# Altium footprint library 电阻封装库.PcbLib: 54 footprints (part 1 of 4)
Each footprint in its own frame and in the unit in brackets; x right, y up, seen from the top. Pads: shape width x height; smd on the part's side, far side on the other; paste and mask are expansions set on the pad; w line width, h text height; cw(c..) or ccw(c..) is an arc to the next point about the centre after c.
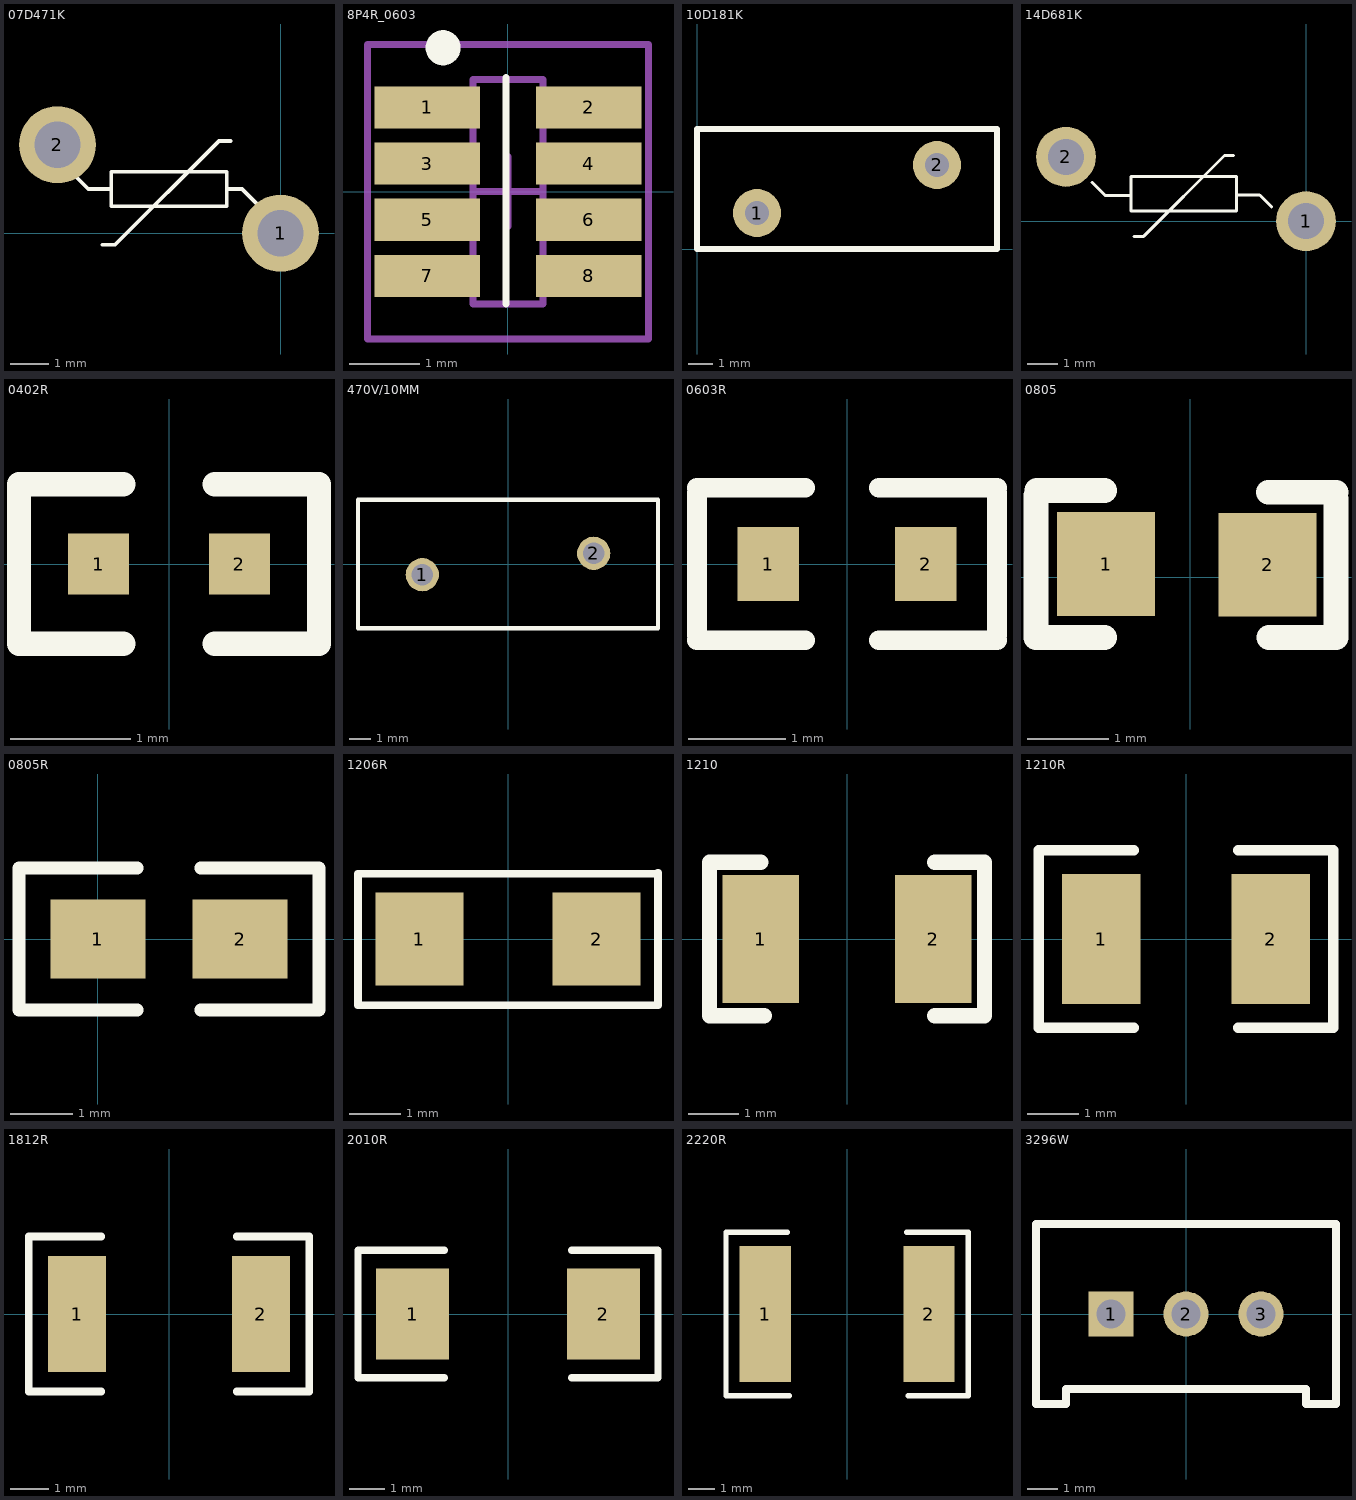
[diagram p0: the footprints below, top view; thin cyan lines are the x and y axes]

## 07D471K [mm]
pads (2):
  round 2 hole 1.2: 1(0,0) 2(-5.8,2.3)
Top Overlay:
  lines w0.1: -5.45,1.6 -5,1.15 -4.4,1.15 ; -4.625,-0.3 -4.3,-0.3 -1.6,2.4 -1.3,2.4 ; -1.4,1.15 -1,1.15 -0.6,0.75 ; -4.4,0.7 -4.4,1.6 -1.4,1.6 -1.4,0.7 -4.4,0.7

## 8P4R_0603 [mm]
pads (8):
  rect 1.5x0.6 smd: 1(-1.15,1.2) 2(1.15,1.2) 3(-1.15,0.4) 4(1.15,0.4) 5(-1.15,-0.4) 6(1.15,-0.4) 7(-1.15,-1.2) 8(1.15,-1.2)
Top Overlay:
  circle w0.25: c-0.925,2.05 r0.125
  lines w0.1: -0.025,-1.6 -0.025,1.626
Mechanical 13:
  lines w0.1: -0.5,-1.6 -0.5,1.6 0.5,1.6 0.5,-1.6 -0.5,-1.6
Mechanical 15:
  lines w0.1: -0.5,0 0.5,0 ; 0,-0.5 0,0.5 ; -2,-2.1 -2,2.1 2,2.1 2,-2.1 -2,-2.1
3D body: height 0.6, standoff 0.1, extent -0.5,-1.6 0.5,1.6
3D body: height 0.6, standoff 0.5, extent -0.838,0.914 -0.483,1.473
3D body: height 0.15, standoff 0, extent -1.219,0.914 -0.838,1.473
3D body: height 0.6, standoff 0, extent -0.864,0.914 -0.813,1.473
3D body: height 0.6, standoff 0.5, extent -0.838,0.127 -0.483,0.686
3D body: height 0.15, standoff 0, extent -1.219,0.127 -0.838,0.686
3D body: height 0.6, standoff 0, extent -0.864,0.127 -0.813,0.686
3D body: height 0.6, standoff 0.5, extent -0.838,-0.686 -0.483,-0.127
3D body: height 0.15, standoff 0, extent -1.219,-0.686 -0.838,-0.127
3D body: height 0.6, standoff 0, extent -0.864,-0.686 -0.813,-0.127
3D body: height 0.6, standoff 0.5, extent -0.838,-1.473 -0.483,-0.914
3D body: height 0.15, standoff 0, extent -1.219,-1.473 -0.838,-0.914
3D body: height 0.6, standoff 0, extent -0.864,-1.473 -0.813,-0.914
3D body: height 0.6, standoff 0, extent 0.813,0.914 0.864,1.473
3D body: height 0.15, standoff 0, extent 0.838,0.914 1.219,1.473
3D body: height 0.6, standoff 0.5, extent 0.483,0.914 0.838,1.473
3D body: height 0.6, standoff 0, extent 0.813,0.127 0.864,0.686
3D body: height 0.15, standoff 0, extent 0.838,0.127 1.219,0.686
3D body: height 0.6, standoff 0.5, extent 0.483,0.127 0.838,0.686
3D body: height 0.6, standoff 0, extent 0.813,-0.686 0.864,-0.127
3D body: height 0.15, standoff 0, extent 0.838,-0.686 1.219,-0.127
3D body: height 0.6, standoff 0.5, extent 0.483,-0.686 0.838,-0.127
3D body: height 0.6, standoff 0, extent 0.813,-1.473 0.864,-0.914
3D body: height 0.15, standoff 0, extent 0.838,-1.473 1.219,-0.914
3D body: height 0.6, standoff 0.5, extent 0.483,-1.473 0.838,-0.914

## 10D181K [mm]
height 16.5
pads (2):
  round 2 hole 1: 1(2.5,1.5) 2(10,3.5)
Top Overlay:
  lines w0.254: 0,0 12.5,0 12.5,5 0,5 0,0

## 14D681K [mm]
pads (2):
  round 2 hole 1.2: 1(0,0) 2(-8.025,2.15)
Top Overlay:
  lines w0.1: -7.151,1.3 -6.701,0.85 -5.9,0.85 ; -5.75,-0.508 -5.425,-0.508 -2.725,2.192 -2.425,2.192 ; -2.3,0.875 -1.575,0.875 ; -1.55,0.875 -1.15,0.475 ; -5.85,0.342 -5.85,1.492 -2.325,1.492 -2.325,0.342 -5.85,0.342

## 0402R [mil]
pads (2):
  rect 20x20 smd: 1(-23,0) 2(23,0)
Top Overlay:
  lines w8: -15,-26 -49,-26 -49,26 -15,26 ; 15,-26 49,-26 49,26 15,26

## 470V/10MM [mm]
pads (2):
  round 1.55 hole 1: 1(-4,-0.5) 2(4,0.5)
Top Overlay:
  lines w0.203: -7,-3 -7,3 7,3 7,-3 -7,-3

## 0603R [mil]
pads (2):
  rect 25x30 smd: 1(-32,0) 2(32,0)
Top Overlay:
  lines w8: -61,-31 -17,-31 ; -61,-29 -61,29 ; -61,31 -17,31 ; 13,-31 61,-31 ; 13,31 61,31 ; 61,-29 61,29

## 0805 [mm]
pads (2):
  rect 1.2x1.27 smd: 1(-1.03,0.165) 2(0.95,0.155)
Top Overlay:
  lines w0.305: -1.89,-0.735 -1.89,1.005 ; -1.88,1.065 -1.05,1.065 ; -1.86,-0.735 -1.05,-0.735 ; 0.96,1.045 1.79,1.045 ; 0.97,-0.735 1.79,-0.735 1.79,0.965
3D body: height 0.5, standoff 0, extent -1.02,-0.46 0.98,0.79

## 0805R [mil]
pads (2):
  rect 60x50 smd: 1(0,0) 2(90,0)
Top Overlay:
  lines w8: 25,-45 -50,-45 -50,45 25,45 ; 65,-45 140,-45 140,45 65,45

## 1206R [mm]
pads (2):
  rect 1.7x1.8 smd: 1(-1.714,0) 2(1.714,0)
Top Overlay:
  lines w0.15: 2.9,-1.279 -2.9,-1.279 -2.9,1.261 2.9,1.261 ; 2.9,-1.261 2.9,1.279
3D body: height 0.6, standoff 0, extent -1.6,-0.838 1.6,0.762

## 1210 [mil]
height 78.35
pads (2):
  rect 60x100 smd: 1(-67.5,0) 2(67.5,0)
Top Overlay:
  lines w12: -67.5,60.24 -107.66,60.24 -107.66,-60.24 -64.74,-60.24 ; 68.72,-60.24 107.7,-60.24 107.7,60.24 68.72,60.24

## 1210R [mil]
pads (2):
  rect 60x100 smd: 1(-65,0) 2(65,0)
Top Overlay:
  lines w8: -40,-68 -113,-68 -113,68 -40,68 ; 40,-68 113,-68 113,68 40,68

## 1812R [mil]
pads (2):
  rect 60x120 smd: 1(-95,0) 2(95,0)
Top Overlay:
  lines w8: -70,-80 -145,-80 -145,80 -70,80 ; 70,-80 145,-80 145,80 70,80

## 2010R [mil]
pads (2):
  rect 80x100 smd: 1(-105,0) 2(105,0)
Top Overlay:
  lines w8: -70,-70 -165,-70 -165,70 -70,70 ; 70,-70 165,-70 165,70 70,70

## 2220R [mil]
pads (2):
  rect 75x200 smd: 1(-120,0) 2(120,0)
Top Overlay:
  lines w8: -87.5,120 -177.5,120 -177.5,-120 -85,-120 ; 87.5,120 177.5,120 177.5,-120 90,-120

## 3296W [mm]
pads (3):
  rect 1.5x1.5 hole 0.95: 1(-2.5,0)
  round 1.5 hole 0.95: 2(0,0) 3(2.5,0)
Top Overlay:
  lines w0.254: -5,-3 -5,3 5,3 5,-3 4,-3 4,-2.5 -4,-2.5 -4,-3 -5,-3
3D body: height 12.67, standoff -3.6, extent -4.9,-2.475 4.9,2.475